# Altium footprint library My_SOMA_1806211.PcbLib: 50 footprints (part 4 of 4)
Each footprint in its own frame and in the unit in brackets; x right, y up, seen from the top. Pads: shape width x height; smd on the part's side, far side on the other; paste and mask are expansions set on the pad; w line width, h text height; cw(c..) or ccw(c..) is an arc to the next point about the centre after c.
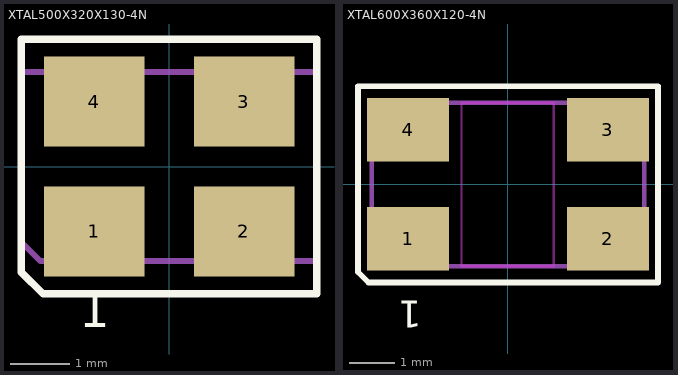
[diagram p3: the footprints below, top view; thin cyan lines are the x and y axes]

## XTAL500X320X130-4N [mil] "ASFL1-12.288MHZ-L-T,XTAL OSC XO 12.2880MHZ HCMOS TTL"
height 51.18
pads (4):
  rect 67x60 smd mask+2: 1(-50,-43.31) 2(50,-43.31) 3(50,43.31) 4(-50,43.31)
Top Overlay:
  lines w5: -98.43,-70.4 -83.83,-85 98.43,-85 98.43,85 -98.43,85 -98.43,-70.4
  text "1" at -60,-115 h40
Mechanical 13:
  lines w4: -98.43,-50.32 -98.43,62.99 98.43,62.99 98.43,-62.99 -85.76,-62.99 -98.43,-50.32
  text ".Designator" at -20.42,-4.32 h40
  text "1" at -55.74,-50.4 h40
  text "2" at 43.22,-46.1 h40
  text "3" at 44.75,33.54 h40
  text "4" at -62.31,32.97 h40
3D body "ASFL1.STEP": height 54.13, standoff 2.95, extent -98.42,-62.99 98.43,63

## XTAL600X360X120-4N [mm] "ABMM2-8.000MHZ-D1-T"
height 1.2
pads (4):
  rect 1.8x1.4 smd mask+0.051: 1(-2.2,-1.2) 2(2.2,-1.2) 3(2.2,1.2) 4(-2.2,1.2)
Top Overlay:
  lines w0.127: -3.302,-1.926 -3.302,2.159 3.302,2.159 3.302,-2.159 -3.069,-2.159 -3.302,-1.926
  text "1" at -1.895,-2.361 h1.02
Keep-Out Layer:
  lines w0.051: -1.024,-1.8 -1.024,1.8 1.004,1.8 1.004,-1.8 -1.024,-1.8
Mechanical 13:
  lines w0.102: -2.646,1.8 -3,1.8 ; -3,1.8 -3,-1.466 -2.666,-1.8 3,-1.8 3,1.8 -3,1.8
  text "4" at -1.863,1.428 h1.02
  text "3" at 2.416,1.534 h1.02
  text "2" at 2.416,-0.953 h1.02
  text "1" at -1.991,-0.88 h1.02
  text ".Designator" at 0.5,-0.014 h1.02
3D body "ABMM2.STEP": height 1.2, standoff 0, extent -3,-1.8 3,1.8